# Altium integrated library PlantiumIntegratedLibrary.IntLib: 638 symbols (part 3 of 6) (continued)
## LED-2ROJ-CDR
designator D?
Red - LED Indication - Discrete 2.2V Radial; Manufacturer Part Number: LN222RPH; Manufacturer: Panasonic Electronic Components; Working Temperature: NC; Short Description: LED RED 2MM ROUND T/H; Frequency: 700nm; Current: 20mA; Temperature Coefficient: NC; Mounting: THT; Power: NC; Ratings: *; Type: LED; Alternate Part Number 2: *; Tolerance: NC; Revision Date: 04/08/21; Package Reference: Radial; Voltage: 2.2V; Value: RED
footprint RADIAL-2.54MM
footprint RADIAL-2.54MM - Small
pins: 1 K, 2 A

## LED-2VER-CDR
designator D?
Green - LED Indication - Discrete 2.2V Radial; Manufacturer Part Number: LN322GP; Manufacturer: Panasonic Electronic Components; Working Temperature: NC; Short Description: LED GREEN DIFFUSED 2MM T/H; Frequency: 565nm; Current: 20mA; Temperature Coefficient: NC; Mounting: THT; Power: NC; Ratings: *; Type: LED; Alternate Part Number 2: *; Tolerance: NC; Revision Date: 04/08/21; Package Reference: Radial; Voltage: 2.2V; Value: GREEN
footprint RADIAL-2.54MM
footprint RADIAL-2.54MM - Small
pins: 1 K, 2 A

## LED-3ROJ-CDR
designator D?
Red 650nm LED Indication - Discrete 2.1V Radial; Manufacturer Part Number: MT1403-RG-A; Manufacturer: Marktech Optoelectronics; Working Temperature: NC; Short Description: LED RED CLEAR 3.0MM ROUND T/H; Ratings: ROHS; Frequency: 700nm; Current: 20mA; Temperature Coefficient: NC; Mounting: THT; Power: NC; Type: LED; Alternate Part Number 2: *; Tolerance: NC; Revision Date: 04/08/21; Package Reference: Radial; Voltage: 2.1V; Value: RED
footprint RADIAL-2.54MM
footprint RADIAL-2.54MM - Small
pins: 1 K, 2 A

## LED-3VER-CLR
designator D?
Green - LED Indication - Discrete 2.2V Radial; Manufacturer Part Number: LN38GCPX; Manufacturer: Panasonic Electronic Components; Working Temperature: NC; Short Description: LED GREEN CLEAR 3MM T/H; Frequency: 565nm; Current: 20mA; Temperature Coefficient: NC; Mounting: THT; Power: NC; Ratings: *; Type: LED; Alternate Part Number 2: *; Tolerance: NC; Revision Date: 04/08/21; Package Reference: Radial; Voltage: 2.2V; Value: GREEN
footprint RADIAL-2.54MM
footprint RADIAL-2.54MM - Small (Footprint not found)
pins: 1 K, 2 A

## LED-LUW-JNSH
designator D?
LED Lighting series White, Cool 6500K 3.05V 20mA 110° 2-SMD, J-Lead; Manufacturer Part Number: LUW JNSH.EC-BTCP-5C8E-1-20-R18; Manufacturer: OSRAM Opto Semiconductors Inc.; Working Temperature: NC; Short Description: LED DURIS E3 COOL WHT 6500K 2SMD; Ratings: REACH, ROHS3; Frequency: ND; Temperature Coefficient: NC; Mounting: SMT; Power: NC; Type: LED; Alternate Part Number 2: *; Tolerance: NC; Current: 20mA; Revision Date: 04/08/21; Package Reference: SMD-2_LED; Voltage: 3.05V; Value: WHITE
footprint SMD-2_LED (Footprint not found)
pins: 1 K, 2 A

## LED-SFH229FA
designator D?
Photodiode 900nm 10ns 34° Radial; Manufacturer Part Number: SFH 229FA; Manufacturer: OSRAM Opto Semiconductors Inc.; Working Temperature: -40°C ~ 100°C; Temperature Coefficient: NC; Short Description: SENSOR PHOTODIODE 900NM RADIAL; Ratings: REACH, ROHS3; Current: 50pA; Voltage: 20V; Value: 730nm ~ 1100nm; Mounting: THT; Power: NC; Type: Photodiode; Frequency: 900nm; Alternate Part Number 2: *; Tolerance: NC; Revision Date: 04/08/21; Package Reference: Radial
footprint RADIAL-2.54MM
footprint RADIAL-2.54MM - Small
pins: 1 K, 2 A

## LED-SFH4350X
designator D?
Infrared (IR) Emitter 860nm 1.5V 100mA 200mW/sr @ 100mA 26° Radial; Manufacturer: OSRAM Opto Semiconductors Inc.; Working Temperature: -40°C ~ 100°C; Temperature Coefficient: NC; Short Description: EMITTER IR 860NM 100MA RADIAL; Ratings: REACH, ROHS3; Manufacturer Part Number: SFH 4350; Mounting: THT; Power: NC; Type: Infrared; Frequency: 860nm; Alternate Part Number 2: *; Tolerance: NC; Current: 100mA; Revision Date: 04/08/21; Package Reference: Radial; Voltage: 1.5V; Value: 200mW/sr @ 100mA
footprint RADIAL-2.54MM
footprint RADIAL-2.54MM - Small
pins: 1 K, 2 A

## LEDSMLV56RGB
designator RGB?
Red, Green, Blue (RGB) 624nm Red, 527nm Green, 470nm Blue LED Indication - Discrete 2.1V Red, 3.3V Green, 3.3V Blue 6-SMD, Flat Leads; Manufacturer Part Number: SMLV56RGB1W1; Manufacturer: Rohm Semiconductor; Working Temperature: NC; Short Description: LED RGB DIFFUSED 1411 SMD; Ratings: REACH, ROHS3; Current: 20mA; Temperature Coefficient: NC; Mounting: SMT; Power: NC; Type: LED; Frequency: 624nm Red, 527nm Green, 470nm Blue; Alternate Part Number 2: *; Tolerance: NC; Revision Date: 04/08/21; Package Reference: 1411; Voltage: 2.1V Red, 3.3V Green, 3.3V Blue; Value: RGB
footprint LED-1411
pins: 1 B+, 2 G+, 3 R+, 4 R-, 5 G-, 6 B-
text: B; G; R


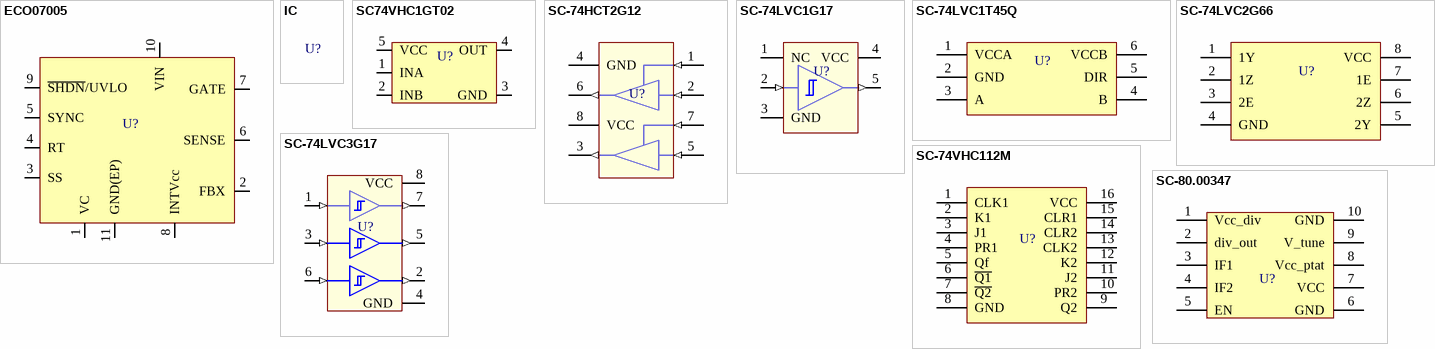
[diagram p14: symbols ECO07005 to SC-80.00347]

## ECO07005
designator U?  (value not drawn)
Boost, Flyback, SEPIC Regulator Positive and Negative Output Step-Up, Step-Up/Step-Down DC-DC Controller IC 10-MSOP-EP; Manufacturer Part Number: LT3757HMSE#PBF; Working Temperature: -40°C ~ 150°C; Short Description: IC CTRLR DC/DC ADJ 10-MSOP; Power: NC; Ratings: ROHS3; Frequency: 100KHZ ~ 1MHZ; Voltage: 2.9V ~ 40V; Value: NC; Mounting: SMT; Type: NC; Alternate Part Number 1: *; Alternate Part Number 2: *; Tolerance: NC; Revision Date: 8/3/22
footprint MSOP_10_EP (10-Lead Plastic MSOP, Exposed Die Pad)
pins: 1 VC, 2 FBX, 3 SS, 4 RT, 5 SYNC, 6 SENSE, 7 GATE, 8 INTVcc, 9 ~{SHDN}/UVLO, 10 VIN, 11 GND(EP)

## IC
designator U?
Working Temperature: NC; Short Description: ND; Value: NC; Manufacturer Part Number: *; Temperature Coefficient: NC; Mounting: *; Power: NC; Ratings: *; Type: NC; Frequency: NC; Alternate Part Number 1: *; Alternate Part Number 2: *; Manufacturer: *; Tolerance: NC; Current: NC; Revision Date: *; Package Reference: *; Voltage: NC

## SC74VHC1GT02
designator U?
NOR Gate IC 1 Channel - 5-TSOP; Manufacturer Part Number: M74VHC1GT02DTT1G; Manufacturer: ON Semiconductor; Working Temperature: -55°C ~ 125°C (TA); Temperature Coefficient: NC; Short Description: IC GATE NOR 1CH 2-INP 5TSOP; Ratings: REACH, ROHS3; Voltage: 3V ~ 5.5V; Value: NC; Mounting: SMT; Power: NC; Type: Gate; Frequency: NC; Alternate Part Number 1: *; Alternate Part Number 2: *; Tolerance: NC; Current: NC; Revision Date: 12/11/21; Package Reference: SOT-23-5
footprint SOT-23-5 (Footprint not found)
pins: 1 INA, 2 INB, 3 GND, 4 OUT, 5 VCC

## SC-74HCT2G12
designator U?
Buffer, Non-Inverting 2 Element 1 Bit per Element 3-State Output 8-XSON, SOT996-2 (2x3); Manufacturer Part Number: 74HCT2G126GD,125; Manufacturer: NXP USA Inc.; Working Temperature: -40°C ~ 125°C (TA); Temperature Coefficient: NC; Short Description: IC BUFFER NON-INVERT 5.5V 8XSON; Ratings: ROHS3; Voltage: 4.5V ~ 5.5V; Value: NC; Mounting: SMT; Power: NC; Type: NC; Frequency: NC; Alternate Part Number 1: *; Alternate Part Number 2: *; Tolerance: NC; Current: NC; Revision Date: 03/08/21; Package Reference: XSON-8
footprint XSON-8 (Footprint not found)
pins: 1 1OE (in), 2 1A (in), 3 2Y (out), 4 GND (power), 5 2A (in), 6 1Y (out), 7 2OE (in), 8 VCC (power)

## SC-74LVC1G17
designator U?
Buffer, Non-Inverting, Schmitt Trigger 1 Element 1 Bit per Element Push-Pull Output SOT-23-5, SC-70-5; Manufacturer Part Number: SN74LVC1G17; Manufacturer: Texas Instruments; Working Temperature: -40°C ~ 125°C (TA); Temperature Coefficient: NC; Short Description: IC BUF NON-INVERT 5.5V SOT23-5 SC70-5; Ratings: ROHS3; Voltage: 1.65V ~ 5.5V; Value: NC; Mounting: SMT; Power: NC; Type: Schmitt Trigger; Frequency: NC; Alternate Part Number 1: *; Alternate Part Number 2: *; Tolerance: NC; Current: NC; Revision Date: 26/04/23; Package Reference: SOT-23-5, SC-70-5
footprint SOT-23-5
footprint SC-70-5
pins: 1 NC, 2 A (in), 3 GND (power), 4 VCC (power), 5 Y (out)

## SC-74LVC1T45Q
designator U?
Voltage Level Translator Bidirectional 1 Circuit 1 Channel 420Mbps SC-70-6; Manufacturer Part Number: SN74LVC1T45QDCKRQ1; Manufacturer: Texas Instruments; Working Temperature: -40°C ~ 125°C (TA); Temperature Coefficient: NC; Short Description: IC TRANSLTR BIDIRECTIONAL SC70-6; Ratings: REACH, ROHS3, AEC-Q100; Voltage: 1.65V ~ 5.5V; Value: NC; Mounting: SMT; Power: NC; Type: Level TRNSLTR; Frequency: NC; Alternate Part Number 1: *; Alternate Part Number 2: *; Tolerance: NC; Current: NC; Revision Date: 11/04/23; Package Reference: SC-70-6
footprint SOT-363-6
pins: 1 VCCA, 2 GND, 3 A, 4 B, 5 DIR, 6 VCCB

## SC-74LVC2G66
designator U?
2 Circuit IC Switch 1:1 10Ohm 8-TSSOP; Manufacturer Part Number: 74LVC2G66DP,125; Manufacturer: Nexperia USA Inc.; Working Temperature: -40°C ~ 125°C (TA); Temperature Coefficient: NC; Short Description: IC SWITCH DUAL SPST 8TSSOP; Ratings: ROHS3; Voltage: 1.65V ~ 5.5V; Value: NC; Mounting: SMT; Power: NC; Type: NC; Frequency: NC; Alternate Part Number 1: *; Alternate Part Number 2: *; Tolerance: NC; Current: NC; Revision Date: 03/08/21; Package Reference: TSSOP-8
footprint TSSOP-8 (Footprint not found)
pins: 1 1Y, 2 1Z, 3 2E, 4 GND, 5 2Y, 6 2Z, 7 1E, 8 VCC

## SC-74LVC3G17
designator U?
Buffer, Non-Inverting, Schmitt Trigger 3 Element 1 Bit per Element Push-Pull Output VSSOP-8; Manufacturer Part Number: SN74LVC3G17DCU; Manufacturer: Texas Instruments; Working Temperature: -40°C ~ 125°C (TA); Temperature Coefficient: NC; Short Description: IC BUFFER NON-INVERT 5.5V; Ratings: ROHS3; Voltage: 1.65V ~ 5.5V; Value: NC; Mounting: SMT; Power: NC; Type: Schmitt Trigger; Frequency: NC; Alternate Part Number 1: *; Alternate Part Number 2: *; Tolerance: NC; Current: NC; Revision Date: 26/04/23; Package Reference: VSSOP-8
footprint VSSOP-8
pins: 1 1A (in), 2 3Y (out), 3 2A (in), 4 GND (power), 5 2Y (out), 6 3A (in), 7 1Y (out), 8 VCC (power)

## SC-74VHC112M
designator U?
Flip Flop 2 Element JK Type 1 Bit Negative Edge 16-TSSOP (0.173", 4.40mm Width); Manufacturer Part Number: 74VHC112MTCX; Manufacturer: ON Semiconductor; Working Temperature: -40°C ~ 85°C (TA); Temperature Coefficient: NC; Short Description: IC FF JK TYPE DUAL 1BIT 16TSSOP; Voltage: 2V ~ 5.5V; Value: NC; Mounting: SMT; Power: NC; Ratings: *; Type: NC; Frequency: NC; Alternate Part Number 1: *; Alternate Part Number 2: *; Tolerance: NC; Current: NC; Revision Date: 03/08/21; Package Reference: TSSOP-16
footprint TSSOP-16 (Footprint not found)
pins: 1 CLK1, 2 K1, 3 J1, 4 PR1, 5 Qf, 6 ~{Q1}, 7 ~{Q2}, 8 GND, 9 Q2, 10 PR2, 11 J2, 12 K2, 13 CLK2, 14 CLR2, 15 CLR1, 16 VCC

## SC-80.00347
designator U?
Proximity/Occupancy Sensor Radar - Analog Signal - -; Manufacturer Part Number: 80.00000347; Manufacturer: InnoSenT GmbH; Working Temperature: -40°C ~ 85°C; Short Description: SMR-334 RADAR MODULE; Power: NC; Ratings: ROHS3; Frequency: 24GHz; Value: NC; Temperature Coefficient: -40°C ~ 85°C; Mounting: SMT; Type: NC; Alternate Part Number 1: *; Alternate Part Number 2: *; Tolerance: NC; Revision Date: 8/3/22; Voltage: NC
footprint SMR-333/334
pins: 1 Vcc_div, 2 div_out, 3 IF1, 4 IF2, 5 EN, 6 GND, 7 VCC, 8 Vcc_ptat, 9 V_tune, 10 GND

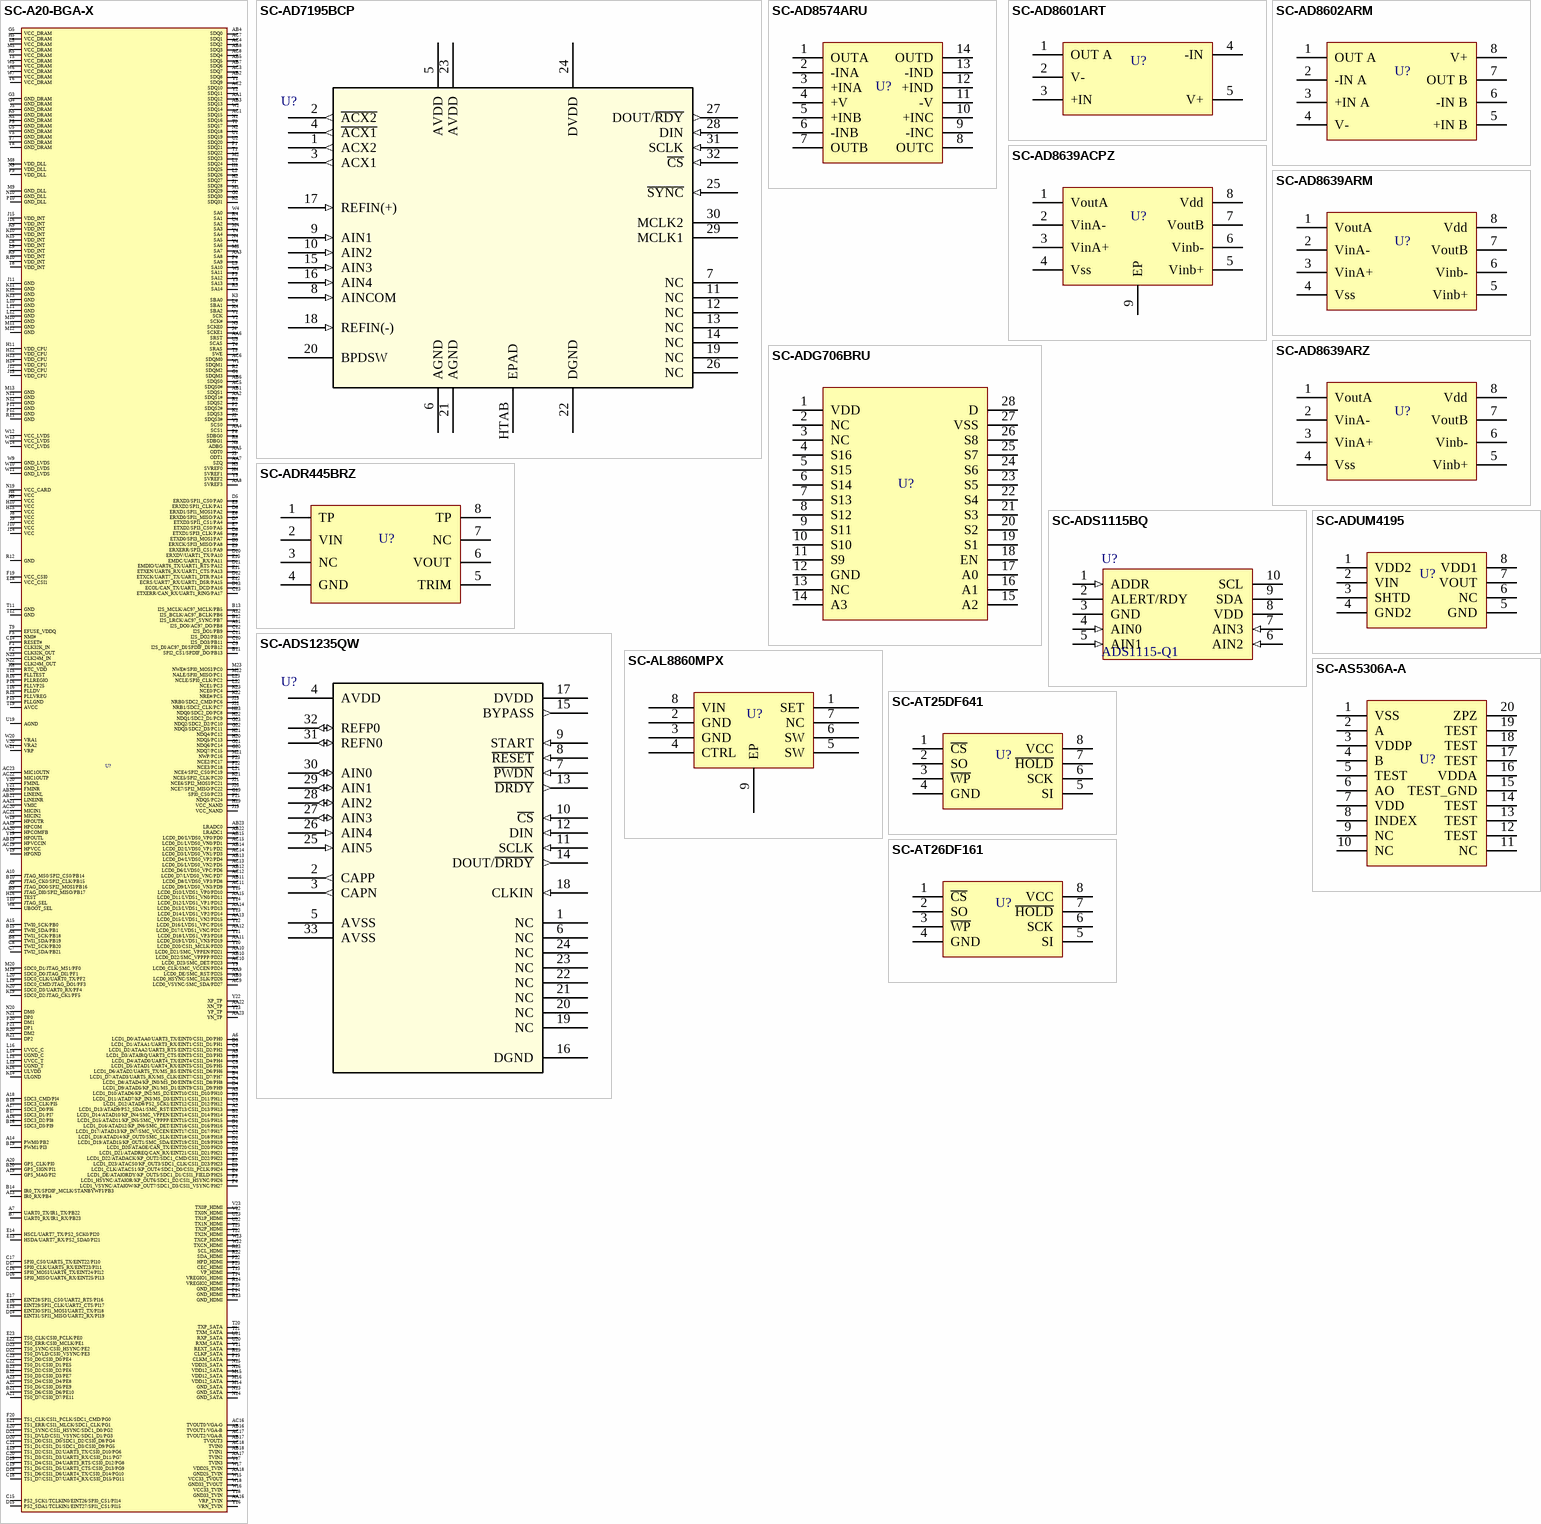
[diagram p15: symbols SC-A20-BGA-X to SC-AT26DF161]

## SC-A20-BGA-X
designator U?
ALLWINNER A20 BGA441 DUAL CORE PROC; Working Temperature: NC; Value: NC; Manufacturer Part Number: Allwinner; Temperature Coefficient: NC; Mounting: SMT; Short Description: ALLWINNER A20 BGA441 DUAL CORE PROC; Power: NC; Ratings: *; Type: NC; Frequency: NC; Alternate Part Number 1: *; Alternate Part Number 2: *; Manufacturer: Allwinner A20; Tolerance: NC; Current: NC; Revision Date: 03/08/21; Package Reference: TFBGA-441; Voltage: NC
footprint TFBGA-441 (Footprint not found)
pins: A1 LCD1_D15/ATAD11/KP_IN5/SMC_VPPPP/EINT15/CSI1_D15/PH15, A2 LCD1_D13/ATAD9/PS2_SDA1/SMC_RST/EINT13/CSI1_D13/PH13, A3 LCD1_D10/ATAD6/KP_IN2/MS_D2/EINT10/CSI1_D10/PH10, A4 LCD1_D6/ATAD2/UART5_TX/MS_BS/EINT6/CSI1_D6/PH6, A5 LCD1_D3/ATAIRQ/UART3_CTS/EINT3/CSI1_D3/PH3, A6 LCD1_D0/ATAA0/UART3_TX/EINT0/CSI1_D0/PH0, A7 UART0_TX/IR1_TX/PB22, A8 TWI1_SCK/PB18, A9 JTAG_DO0/SPI2_MOSI/PB16, A10 JTAG_MS0/SPI2_CS0/PB14, A11 I2S_DO0/AC97_DO/PB8, A12 I2S_BCLK/AC97_BCLK/PB6, A13 IR0_RX/PB4, A14 PWM0/PB2, A15 TWI0_SCK/PB0, A16 SDC3_D2/PI8, A17 SDC3_D0/PI6, A18 SDC3_CMD/PI4, A19 GPS_MAG/PI2, A20 GPS_CLK/PI0, A21 TS0_D7/CSI0_D7/PE11, A22 TS0_D5/CSI0_D5/PE9, A23 TS0_D4/CSI0_D4/PE8, AA1 SDQ12, AA2 SDQS1#, AA3 SA8, AA4 SCS1, AA5 ODT0, AA6 SRST, AA7 SZQ, AA8 SVREF3, AA9 LCD0_DE/SMC_RST/PD25, AA10 LCD0_D21/SMC_VPPEN/PD21, AA11 LCD0_D19/LVDS1_VN3/PD19, AA12 LCD0_D17/LVDS1_VNC/PD17, AA13 LCD0_D15/LVDS1_VN2/PD15, AA14 LCD0_D13/LVDS1_VN1/PD13, AA15 LCD0_D11/LVDS1_VN0/PD11, AA16 VRP_TVIN, AA17 TVIN2, AA18 GND25_TVIN, AA19 HPCOM, AA20 HPCOMFB, AA21 VMIC, AA22 XN_TP, AA23 YN_TP, AB1 SDQS1, AB2 SDQ8, AB3 SDQ13, AB4 SDQ0, AB5 SDQ5, AB6 SDQS0, AB7 SDQ6, AB8 SDQ3, AB9 LCD0_HSYNC/SMC_SLK/PD26, AB10 LCD0_D22/SMC_VPPPP/PD22, AB11 LCD0_D8/LVDS0_VP3/PD8, AB12 LCD0_D6/LVDS0_VPC/PD6, AB13 LCD0_D4/LVDS0_VP2/PD4, AB14 LCD0_D2/LVDS0_VP1/PD2, AB15 LCD0_D0/LVDS0_VP0/PD0, AB16 TVOUT1/VGA-B, AB17 TVOUT3, AB18 TVIN1, AB19 HPVCCIN, AB20 LINEINL, AB21 LINEINR, AB22 LRADC1, AB23 LRADC0, AC1 SDQ15, AC2 SDQ10, AC3 SDQ7, AC4 SDQ2, AC5 SDQS0#, AC6 SDQM0, AC7 SDQ1, AC8 SDQ4, AC9 LCD0_VSYNC/SMC_SDA/PD27, AC10 LCD0_D23/SMC_DET/PD23, AC11 LCD0_D9/LVDS0_VN3/PD9, AC12 LCD0_D7/LVDS0_VNC/PD7, AC13 LCD0_D5/LVDS0_VN2/PD5, AC14 LCD0_D3/LVDS0_VN1/PD3, AC15 LCD0_D1/LVDS0_VN0/PD1, AC16 TVOUT0/VGA-G, AC17 TVOUT2/VGA-R, AC18 TVIN0, AC19 HPVCC, AC20 MICIN1, AC21 MICIN2, AC22 MIC1OUTP, AC23 MIC1OUTN, B1 LCD1_D16/ATAD12/KP_IN6/SMC_DET/EINT16/CSI1_D16/PH16, B2 LCD1_D14/ATAD10/KP_IN4/SMC_VPPEN/EINT14/CSI1_D14/PH14, B3 LCD1_D11/ATAD7/KP_IN3/MS_D3/EINT11/CSI1_D11/PH11, B4 LCD1_D7/ATAD3/UART5_RX/MS_CLK/EINT7/CSI1_D7/PH7, B5 LCD1_D4/ATAD0/UART4_TX/EINT4/CSI1_D4/PH4, B6 LCD1_D1/ATAA1/UART3_RX/EINT1/CSI1_D1/PH1, B7 UART0_RX/IR1_RX/PB23, B8 TWI1_SDA/PB19, B9 JTAG_DI0/SPI2_MISO/PB17, B10 JTAG_CK0/SPI2_CLK/PB15, B11 SPI2_CS1/SPDIF_DO/PB13, B12 I2S_LRCK/AC97_SYNC/PB7, B13 I2S_MCLK/AC97_MCLK/PB5, B14 IR0_TX/SPDIF_MCLK/STANBYWFI/PB3, B15 TWI0_SDA/PB1, B16 SDC3_D3/PI9, B17 SDC3_D1/PI7, B18 SDC3_CLK/PI5, B19 PWM1/PI3, B20 GPS_SIGN/PI1, B21 TS0_D6/CSI0_D6/PE10, B22 TS0_D3/CSI0_D3/PE7, B23 TS0_D2/CSI0_D2/PE6, C1 LCD1_D17/ATAD13/KP_IN7/SMC_VCCEN/EINT17/CSI1_D17/PH17, C2 LCD1_D18/ATAD14/KP_OUT0/SMC_SLK/EINT18/CSI1_D18/PH18, C3 LCD1_D12/ATAD8/PS2_SCK1/EINT12/CSI1_D12/PH12, C4 LCD1_D8/ATAD4/KP_IN0/MS_D0/EINT8/CSI1_D8/PH8, C5 LCD1_D5/ATAD1/UART4_RX/EINT5/CSI1_D5/PH5, C6 LCD1_D2/ATAA2/UART3_RTS/EINT2/CSI1_D2/PH2, C7 TWI2_SDA/PB21, C8 TWI2_SCK/PB20, C9 I2S_DI/AC97_DI/SPDIF_DI/PB12, C10 I2S_DO3/PB11, C11 I2S_DO2/PB10, C12 I2S_DO1/PB9, C13 ETXERR/CAN_RX/UART1_RING/PA17, C14 RESET#, C15 PS2_SCK1/TCLKIN0/EINT26/SPI0_CS1/PI14, C16 SPI0_MOSI/UART6_TX/EINT24/PI12, C17 SPI0_CS0/UART5_TX/EINT22/PI10, C18 TS1_D7/CSI1_D7/UART4_RX/CSI0_D15/PG11, C19 TS1_D5/CSI1_D5/UART3_CTS/CSI0_D13/PG9, C20 TS1_D3/CSI1_D3/UART3_RX/CSI0_D11/PG7, C21 TS1_D1/CSI1_D1/SDC1_D3/CSI0_D9/PG5, C22 TS0_D1/CSI0_D1/PE5, C23 TS0_D0/CSI0_D0/PE4, D1 LCD1_D19/ATAD15/KP_OUT1/SMC_SDA/EINT19/CSI1_D19/PH19, D2 LCD1_D20/ATAOE/CAN_TX/EINT20/CSI1_D20/PH20, D3 LCD1_D21/ATADREQ/CAN_RX/EINT21/CSI1_D21/PH21, D4 LCD1_D9/ATAD5/KP_IN1/MS_D1/EINT9/CSI1_D9/PH9, D5 ERXD3/SPI1_CS0/PA0, D6 ERXD1/SPI1_MOSI/PA2, D7 ETXD3/SPI1_CS1/PA4, D8 ETXD1/SPI3_CLK/PA6, D9 ERXCK/SPI3_MISO/PA8, D10 ERXDV/UART1_TX/PA10, D11 EMDIO/UART6_TX/UART1_RTS/PA12, D12 ETXCK/UART7_TX/UART1_DTR/PA14, D13 ECOL/CAN_TX/UART1_DCD/PA16, D14 EINT31/SPI1_MISO/UART2_RX/PI19, D15 PS2_SDA1/TCLKIN1/EINT27/SPI1_CS1/PI15, D16 SPI0_MISO/UART6_RX/EINT25/PI13, D17 SPI0_CLK/UART5_RX/EINT23/PI11, D18 TS1_D6/CSI1_D6/UART4_TX/CSI0_D14/PG10, D19 TS1_D4/CSI1_D4/UART3_RTS/CSI0_D12/PG8, D20 TS1_D0/CSI1_D0/SDC1_D2/CSI0_D8/PG4, D21 TS1_DVLD/CSI1_VSYNC/SDC1_D1/PG3, D22 TS0_DVLD/CSI0_VSYNC/PE3, D23 TS0_SYNC/CSI0_HSYNC/PE2, E1 LCD1_D22/ATADACK/KP_OUT2/SDC1_CMD/CSI1_D22/PH22, E2 LCD1_D23/ATACS0/KP_OUT3/SDC1_CLK/CSI1_D23/PH23, E3 LCD1_CLK/ATACS1/KP_OUT4/SDC1_D0/CSI1_PCLK/PH24, E4 LCD1_DE/ATAIORDY/KP_OUT5/SDC1_D1/CSI1_FIELD/PH25, E5 ERXD2/SPI1_CLK/PA1, E6 ERXD0/SPI1_MISO/PA3, E7 ETXD2/SPI3_CS0/PA5, E8 ETXD0/SPI3_MOSI/PA7, E9 ERXERR/SPI3_CS1/PA9, E10 EMDC/UART1_RX/PA11, E11 ETXEN/UART6_RX/UART1_CTS/PA13, E12 ECRS/UART7_RX/UART1_DSR/PA15, E13 HSDA/UART7_RX/PS2_SDA0/PI21, E14 HSCL/UART7_TX/PS2_SCK0/PI20, E15 EINT30/SPI1_MOSI/UART2_TX/PI18, E16 EINT29/SPI1_CLK/UART2_CTS/PI17, E17 EINT28/SPI1_CS0/UART2_RTS/PI16, E18 VCC_CSI1, E19 TS1_D2/CSI1_D2/UART3_TX/CSI0_D10/PG6, E20 TS1_SYNC/CSI1_HSYNC/SDC1_D0/PG2, E21 TS1_ERR/CSI1_MLCK/SDC1_CLK/PG1, E22 TS0_ERR/CSI0_MCLK/PE1, E23 TS0_CLK/CSI0_PCLK/PE0, F1 CLK32K_IN, F2 CLK32K_OUT, F3 LCD1_HSYNC/ATAIOR/KP_OUT6/SDC1_D2/CSI1_HSYNC/PH26, F4 LCD1_VSYNC/ATAIOW/KP_OUT7/SDC1_D3/CSI1_VSYNC/PH27, F5 NMI#, F19 VCC_CSI0, F20 TS1_CLK/CSI1_PCLK/SDC1_CMD/PG0, F21 NDQS/PC24, F22 NCE3/PC18, F23 NCE2/PC17, G1 SDQM3, G2 SDQ30, G3 GND_DRAM, G4 GND_DRAM, G5 VCC_DRAM, G19 SPI0_CS0/PC23, G20 NDQ7/PC15, G21 NDQ6/PC14, G22 NDQ3/SDC2_D3/PC11, G23 NDQ2/SDC2_D2/PC10, H1 SDQ25, H2 SDQ27, H3 SVREF0, H4 SVREF1, H5 VCC_DRAM, H8 VCC, H9 VCC, H10 VCC, H11 VDD_CPU, H12 VDD_CPU, H13 VDD_CPU, H14 VDD_CPU, H15 VCC, H16 TEST, H19 VCC_NAND, H20 NDQ5/PC13, H21 NDQ4/PC12, H22 NDQ1/SDC2_D1/PC9, H23 NDQ0/SDC2_D0/PC8, J1 SDQ28, J2 SDQS3#, J3 ODT1, J4 SCKE1, J5 GND_DRAM, J8 VCC, J9 VCC, J10 VCC, J11 GND, J12 VDD_CPU, J13 VDD_CPU, J14 VCC, J15 VDD_INT, J16 VDD_INT, J19 VCC_NAND, J20 NCE7/SPI2_MISO/PC22, J21 NCE6/SPI2_MOSI/PC21, J22 NRB1/SDC2_CLK/PC7, J23 NRB0/SDC2_CMD/PC6, K1 SDQS3, K2 SDQ31, K3 SBA0, K4 SBA2, K5 GND_DRAM, K8 RTC_VDD, K9 VDD_INT, K10 VDD_INT, K11 GND, K12 GND, K13 GND, K14 ULGND, K15 VDD_INT, K16 ULVDD, K19 SDC0_D2/JTAG_CK1/PF5, K20 SDC0_D3/UART0_RX/PF4, K21 NCE5/SPI2_CLK/PC20, K22 NRE#/PC5, K23 NCE0/PC4, L1 SDQ24, L2 SDQ26, L3 SA10, L4 SBA1, L5 VCC_DRAM, L8 VDD_INT, L9 VDD_INT, L10 GND, L11 GND, L12 GND, L13 UGND_T, L14 UGND_C, L15 UVCC_T, L16 UVCC_C, L19 SDC0_CMD/JTAG_DO1/PF3, L20 SDC0_CLK/UART0_TX/PF2, L21 NCE4/SPI2_CS0/PC19, L22 NCE1/PC3, L23 NCLE/SPI0_CLK/PC2, M1 SDQ29, M2 SDQ23, M3 SA7, M4 SA3, M5 VCC_DRAM, M8 VDD_DLL, M9 GND_DLL, M10 GND, M11 GND, M12 GND, M13 GND, M14 GND_SATA, M15 VDD12_SATA, M16 VDD12_SATA, M19 SDC0_D0/JTAG_DI1/PF1, M20 SDC0_D1/JTAG_MS1/PF0, M21 NWP/PC16, M22 NALE/SPI0_MISO/PC1, M23 NWE#/SPI0_MOSI/PC0, N1 SDQ16, N2 SDQ18, N3 SCKE0, N4 SA5, N5 GND_DRAM, N8 ADBG, N9 VDD_DLL, N10 GND_DLL, N11 GND, N12 GND, N13 GND_SATA, N14 GND_SATA, N15 VDD25_SATA, N16 VDD12_SATA, N19 VCC_CARD, N20 DM0, N21 DP0, N22 CLK24M_OUT, N23 CLK24M_IN, P1 SDQ21, P2 SDQS2#, P3 SA12, P4 SA9, P5 GND_DRAM, P8 SDBG0, P9 VDD_DLL, P10 GND_DLL, P11 GND, P12 GND, P13 GND_HDMI, P14 GND_HDMI, P15 PLLGND, P16 PLLVP25, P19 CLKM_SATA, P20 DM1, P21 DP1, P22 HPD_HDMI, P23 CEC_HDMI, R1 SDQS2, R2 SDQM2, R3 SA14, R4 SA1, R5 VCC_DRAM, R8 SDBG1, R9 VDD_INT, R10 VDD_INT, R11 GND, R12 GND, R13 GND_HDMI, R14 VREGIO2_HDMI, R15 PLLVREG, R16 PLLREGIO, R19 CLKP_SATA, R20 DM2, R21 DP2, R22 SDA_HDMI, R23 SCL_HDMI, T1 SDQ22, T2 SDQ17, T3 SWE, T4 SRAS, T5 VCC_DRAM, T8 VDD_INT, T9 EFUSE_VDDQ, T10 JTAG_SEL, T11 GND, T12 GND, T13 VP_HDMI, T14 VREGIO1_HDMI, T15 PLLTEST, T16 PLLDV, T19 AVCC, T20 TXP_SATA, T21 TXM_SATA, T22 TX2N_HDMI, T23 TX2P_HDMI, U1 SDQ19, U2 SDQ20, U3 SCAS, U4 SA2, U5 GND_DRAM, U19 AGND, U20 RXM_SATA, U21 RXP_SATA, U22 TX1N_HDMI, U23 TX1P_HDMI, V1 SCK, V2 SCK#, V3 SCS0, V4 SA6, V5 GND_DRAM, V19 HPGND, V20 VRA2, V21 REXT_SATA, V22 TX0N_HDMI, V23 TX0P_HDMI, W1 SDQM1, W2 SDQ14, W3 SA11, W4 SA0, W5 VCC_DRAM, W6 VCC_DRAM, W7 VCC_DRAM, W8 UBOOT_SEL, W9 GND_LVDS, W10 GND_LVDS, W11 GND_LVDS, W12 VCC_LVDS, W13 VCC_LVDS, W14 VCC_LVDS, W15 VCC33_TVOUT, W16 VCC33_TVIN, W17 VDD25_TVIN, W18 GND33_TVOUT, W19 HPOUTR, W20 VRA1, W21 VRP, W22 TXCN_HDMI, W23 TXCP_HDMI, Y1 SDQ9, Y2 SDQ11, Y3 SA13, Y4 SA4, Y5 SVREF2, Y6 VCC_DRAM, Y7 GND_DRAM, Y8 GND_DRAM, Y9 LCD0_CLK/SMC_VCCEN/PD24, Y10 LCD0_D20/CSI1_MCLK/PD20, Y11 LCD0_D18/LVDS1_VP3/PD18, Y12 LCD0_D16/LVDS1_VPC/PD16, Y13 LCD0_D14/LVDS1_VP2/PD14, Y14 LCD0_D12/LVDS1_VP1/PD12, Y15 LCD0_D10/LVDS1_VP0/PD10, Y16 VRN_TVIN, Y17 TVIN3, Y18 GND33_TVIN, Y19 HPOUTL, Y20 FMINL, Y21 FMINR, Y22 XP_TP, Y23 YP_TP